# Altium footprint library PCB_Lib_Devzone.PcbLib: 491 footprints (part 16 of 31)
Each footprint in its own frame and in the unit in brackets; x right, y up, seen from the top. Pads: shape width x height; smd on the part's side, far side on the other; paste and mask are expansions set on the pad; w line width, h text height; cw(c..) or ccw(c..) is an arc to the next point about the centre after c.
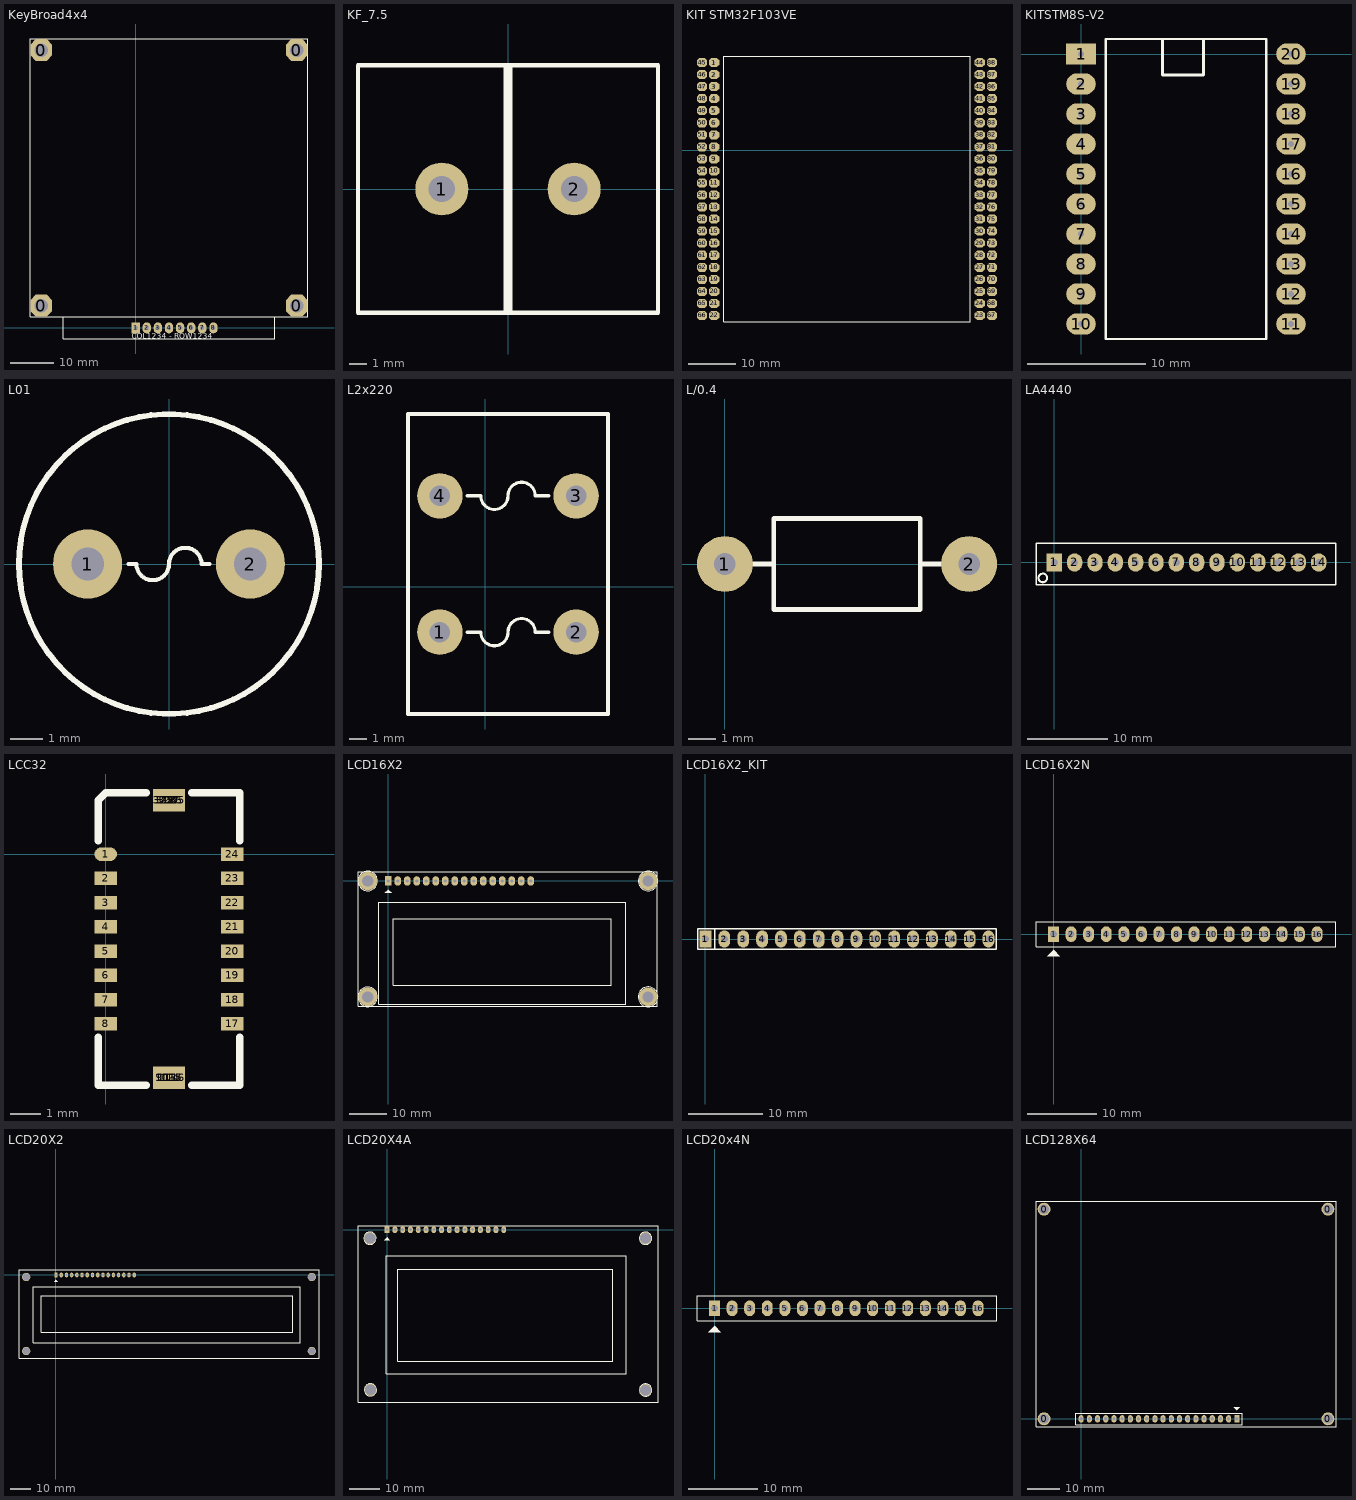
[diagram p15: the footprints below, top view; thin cyan lines are the x and y axes]

## KeyBroad4x4 [mm] "KeyBroad 4x4"
height 5.08
pads (12):
  oct 5x5 hole 3.048: 0(-21.59,5.08) 0(-21.59,63.5) 0(36.83,5.08) 0(36.83,63.5)
  rect 1.905x2.5 hole 1: 1(0,0)
  oval 1.905x2.5 hole 1: 2(2.54,0) 3(5.08,0) 4(7.62,0) 5(10.16,0) 6(12.7,0) 7(15.24,0) 8(17.78,0)
Top Overlay:
  lines w0.203: -16.51,2.54 -16.51,-2.515 -16.535,-2.54 31.75,-2.54 31.75,2.489 ; -24.13,2.54 39.37,2.54 39.37,66.04 -24.13,66.04 -24.13,2.54
  text "COL1234 - ROW1234" at -0.889,-2.464 h1.27

## KF_7.5 [mm]
pads (2):
  round 3 hole 1.5: 1(-3.75,0) 2(3.75,0)
Top Overlay:
  lines w0.254: -8.5,-7 8.5,-7 8.5,7 -8.5,7 -8.5,-7
  lines w0.508: 0,-6.858 0,6.858

## KIT STM32F103VE [mil]
pads (88):
  oct 85x75 hole 23.62: 1(728,728) 2(728,628) 3(728,528) 4(728,428) 5(728,328) 6(728,228) 7(728,128) 8(728,28) 9(728,-72) 10(728,-172) 11(728,-272) 12(728,-372) 13(728,-472) 14(728,-572) 15(728,-672) 16(728,-772) 17(728,-872) 18(728,-972) 19(728,-1072) 20(728,-1172) 21(728,-1272) 22(728,-1372) 23(2932.72,-1372) 24(2932.72,-1272) 25(2932.72,-1172) 26(2932.72,-1072) 27(2932.72,-972) 28(2932.72,-872) 29(2932.72,-772) 30(2932.72,-672) 31(2932.72,-572) 32(2932.72,-472) 33(2932.72,-372) 34(2932.72,-272) 35(2932.72,-172) 36(2932.72,-72) 37(2932.72,28) 38(2932.72,128) 39(2932.72,228) 40(2932.72,328) 41(2932.72,428) 42(2932.72,528) 43(2932.72,628) 44(2932.72,728) 45(628,728) 46(628,628) 47(628,528) 48(628,428) 49(628,328) 50(628,228) 51(628,128) 52(628,28) 53(628,-72) 54(628,-172) 55(628,-272) 56(628,-372) 57(628,-472) 58(628,-572) 59(628,-672) 60(628,-772) 61(628,-872) 62(628,-972) 63(628,-1072) 64(628,-1172) 65(628,-1272) 66(628,-1372) 67(3033.51,-1372) 68(3033.51,-1272) 69(3033.51,-1172) 70(3033.51,-1072) 71(3033.51,-972) 72(3033.51,-872) 73(3033.51,-772) 74(3033.51,-672) 75(3033.51,-572) 76(3033.51,-472) 77(3033.51,-372) 78(3033.51,-272) 79(3033.51,-172) 80(3033.51,-72) 81(3033.51,28) 82(3033.51,128) 83(3033.51,228) 84(3033.51,328) 85(3033.51,428) 86(3033.51,528) 87(3033.51,628) 88(3033.51,728)
Top Overlay:
  lines w7.87: 1805,778 2854.57,778 2854.57,-1422 806.15,-1422 806.15,778 1805.36,778

## KITSTM8S-V2 [mm]
pads (20):
  rect 2.5x1.8 hole 0.5: 1(0,0)
  oval 2.5x1.8 hole 0.5: 2(0,-2.54) 3(0,-5.08) 4(0,-7.62) 5(0,-10.16) 6(0,-12.7) 7(0,-15.24) 8(0,-17.78) 9(0,-20.32) 10(0,-22.86) 11(17.78,-22.86) 12(17.78,-20.32) 13(17.78,-17.78) 14(17.78,-15.24) 15(17.78,-12.7) 16(17.78,-10.16) 17(17.78,-7.62) 18(17.78,-5.08) 19(17.78,-2.54) 20(17.78,0)
Top Overlay:
  lines w0.152: 6.909,1.245 10.363,1.245
  lines w0.2: 8.534,1.27 15.695,1.27 15.695,-24.13 2.085,-24.13 2.085,1.27 8.661,1.27
  lines w0.254: 6.909,1.245 6.909,-1.778 10.363,-1.778 10.363,1.245

## L01 [mil] "Inductor"
pads (2):
  round 85 hole 40: 1(-100,0) 2(100,0)
Top Overlay:
  circle w7: c0,0 r184.39
  lines w5: -50,0 -40,0 ccw(c-20,0) 0,0 cw(c20,0) 40,0 50,0

## L2x220 [mil] "Loc 220"
pads (4):
  round 100 hole 45: 1(-100,-100) 2(200,-100) 3(200,200) 4(-100,200)
Top Overlay:
  lines w7: -10,-100 ccw(c20,-100) 50,-100 cw(c80,-100) 110,-100 ; -10,200 ccw(c20,200) 50,200 cw(c80,200) 110,200
  lines w8: -40,-100 -10,-100 ; -40,200 -10,200 ; 110,-100 140,-100 ; 110,200 140,200 ; -170,-280 270,-280 270,380 -170,380 -170,-280

## L/0.4 [mil] "Inductor , 2 Pin, L 350mil, W 150 mil"
height 150
pads (2):
  round 80 hole 31: 1(0,0) 2(350,0)
Top Overlay:
  lines w7: 70,0 40,0 70,0 ; 70,0 70,65 280,65 280,0 ; 70,0 70,-65 280,-65 280,0 ; 280,0 310,0 280,0

## LA4440 [mil]
pads (14):
  rect 75x90 hole 34: 1(0,0)
  oval 75x90 hole 34: 2(100,0) 3(200,0) 4(300,0) 5(400,0) 6(500,0) 7(600,0) 8(700,0) 9(800,0) 10(900,0) 11(1000,0) 12(1100,0) 13(1200,0) 14(1300,0)
Top Overlay:
  circle w10: c-56.38,-76 r21.38
  lines w7: -90,-110 1385,-110 1385,95 -26,95 -90,95 -90,-110

## LCC32 [mil]
pads (32):
  oval 29.53x17.72 smd: 1(0,0)
  rect 29.53x17.72 smd: 2(0,-31.5) 3(0,-63) 4(0,-94.5) 5(0,-126) 6(0,-157.5) 7(0,-189) 8(0,-220.5) 17(164.5,-220.5) 18(164.5,-189) 19(164.5,-157.5) 20(164.5,-126) 21(164.5,-94.5) 22(164.5,-63) 23(164.5,-31.5) 24(164.5,0)
  rect 17.72x29.53 smd: 9(70,-290.5) 10(73.5,-290.5) 11(77,-290.5) 12(80.5,-290.5) 13(84,-290.5) 14(87.5,-290.5) 15(91,-290.5) 16(94.5,-290.5) 25(94.5,70) 26(91,70) 27(87.5,70) 28(84,70) 29(80.5,70) 30(77,70) 31(73.5,70) 32(70,70)
Top Overlay:
  lines w10: -9.77,-238.22 -9.77,-300.26 52.28,-300.26 ; -9.77,17.72 -9.77,70 0,79.77 52.28,79.77 ; 112.22,-300.26 174.26,-300.26 174.26,-238.22 ; 112.22,79.77 174.26,79.77 174.26,17.72

## LCD16X2 [mil] "LCD dipslay 16x2, 16 pin"
height 400
pads (20):
  rect 70x100 hole 36: 1(0,0)
  oval 70x100 hole 36: 2(100,0) 3(200,0) 4(300,0) 5(400,0) 6(500,0) 7(600,0) 8(700,0) 9(800,0) 10(900,0) 11(1000,0) 12(1100,0) 13(1200,0) 14(1300,0) 15(1400,0) 16(1500,0)
  round 196.85 hole 118.11: "Hole 0"(-216.54,-1220.47) "Hole 0"(-216.54,0) "Hole 0"(2736.22,-1220.47) "Hole 0"(2736.22,0)
Top Overlay:
  circle w7: c-216.54,-1220.47 r102.5
  circle w7: c-216.54,0 r102.47
  circle w7: c2736.22,0 r102.23
  circle w7: c2736.22,-1220.47 r104.23
  region: 0,-90 -35,-125 35,-125
  lines w7: -314.96,-1318.9 2834.65,-1318.9 2834.65,98.43 -314.96,98.43 -314.96,-1318.9 ; -100,-1300 2500,-1300 2500,-225 -100,-225 -100,-1300 ; 50,-1100 50,-400 2350,-400 2350,-1100 50,-1100
3D body "LCD module 16 X 2 backlight.STEP": height 414, standoff -106, extent -314.65,-1360 2854.65,77.01

## LCD16X2_KIT [mil]
pads (16):
  rect 62x90 hole 36: 1(0,0)
  oval 62x90 hole 36: 2(100,0) 3(200,0) 4(300,0) 5(400,0) 6(500,0) 7(600,0) 8(700,0) 9(800,0) 10(900,0) 11(1000,0) 12(1100,0) 13(1200,0) 14(1300,0) 15(1400,0) 16(1500,0)
Top Overlay:
  lines w7: -40,-55 1540,-55 1540,55 -40,55 -40,-55
  lines w7.87: 50,-54 50,54
3D body "LCD module 16 X 2 backlight.STEP": height 854, standoff 334, extent -315,-1366.5 2854.29,70.5
3D body "female_header_a-bl254-eg-g16d.stp": height 334.65, standoff -125.98, extent -51.92,-52.43 1557.92,46
3D body "pin_header_aw140-eg-g16d.stp": height 558.11, standoff 117.17, extent -46,-58 1554,40.36

## LCD16X2N [mil] "LCD dipslay 16x2, 16 pin"
height 400
pads (16):
  rect 62x90 hole 39: 1(0,0)
  oval 62x90 hole 39: 2(100,0) 3(200,0) 4(300,0) 5(400,0) 6(500,0) 7(600,0) 8(700,0) 9(800,0) 10(900,0) 11(1000,0) 12(1100,0) 13(1200,0) 14(1300,0) 15(1400,0) 16(1500,0)
Top Overlay:
  region: 0,-90 -35,-125 35,-125
  lines w7: -100,-71 1608,-71 1608,70 -100,70 -100,-71
3D body "lcd16.STEP": height 764, standoff 244, extent -319.64,-1353.49 2849.65,83.51
3D body "jp16.stp": height 468.11, standoff -20.08, extent -48.03,-48.43 1548.03,50
3D body "socket16.stp": height 276.19, standoff -117.51, extent -50,-44.99 1550,55.01

## LCD20X2 [mil] "LCD dipslay 20x2, 16 pin"
height 400
pads (20):
  rect 62x90 hole 36: 1(0,0)
  oval 62x90 hole 36: 2(100,0) 3(200,0) 4(300,0) 5(400,0) 6(500,0) 7(600,0) 8(700,0) 9(800,0) 10(900,0) 11(1000,0) 12(1100,0) 13(1200,0) 14(1300,0) 15(1400,0) 16(1500,0)
  round 157.48 hole 137.8: "Hole 0"(-570.87,-1456.69) "Hole 0"(-570.87,-39.37) "Hole 0"(4901.57,-1456.69) "Hole 0"(4901.57,-39.37)
Top Overlay:
  region: 0,-90 -35,-125 35,-125
  lines w7: -708.66,-1594.49 5039.37,-1594.49 5039.37,100 -708.66,100 -708.66,-1594.49 ; -436,-1300 4682,-1300 4682,-225 -436,-225 -436,-1300 ; -286,-1100 4532,-1100 4532,-400 -286,-400 -286,-1100
3D body "SW3dPS-Display20x2.STEP": height 198, standoff -180, extent -100,-1437 4470,33

## LCD20X4A [mil] "LCD dipslay 20x4, 16 pin"
height 400
pads (20):
  rect 62x90 hole 39: 1(0,0)
  oval 62x90 hole 39: 2(100,0) 3(200,0) 4(300,0) 5(400,0) 6(500,0) 7(600,0) 8(700,0) 9(800,0) 10(900,0) 11(1000,0) 12(1100,0) 13(1200,0) 14(1300,0) 15(1400,0) 16(1500,0)
  round 157.48 hole 137.8: "Hole 0"(-220,-110) "Hole 0"(-215,-2060) "Hole 0"(3325,-2065) "Hole 0"(3325,-110)
Top Overlay:
  circle w7: c3324.94,-2063 r79.06
  circle w7: c3324.94,-110 r79.06
  circle w7: c-221.06,-110 r79.06
  circle w7: c-215.06,-2061 r79.06
  region: 0,-100 -35,-135 35,-135
  lines w7: -375,-2220 -375,50 3485,50 3485,-2220 -374,-2220 ; -11,-1852 -11,-337 3076,-337 3076,-1852 -11,-1852 ; 139,-1695 139,-512 2905,-512 2905,-1695 139,-1695
3D body "User Library-LCD20_4.STEP": height 417.32, standoff -125.98, extent -392.13,-2264.2 3466.13,98

## LCD20x4N [mil] "LCD dipslay 20x4, 16 pin"
height 400
pads (16):
  rect 62x90 hole 39: 1(0,0)
  oval 62x90 hole 39: 2(100,0) 3(200,0) 4(300,0) 5(400,0) 6(500,0) 7(600,0) 8(700,0) 9(800,0) 10(900,0) 11(1000,0) 12(1100,0) 13(1200,0) 14(1300,0) 15(1400,0) 16(1500,0)
Top Overlay:
  region: 0,-100 -35,-135 35,-135
  lines w7: -100,-71 1608,-71 1608,70 -100,70 -100,-71
3D body "User Library-LCD20_4.STEP": height 417.32, standoff -125.98, extent -392,-2265.2 3466.27,97

## LCD128X64 [mil] "LCD Graphic 128x64, 20 pin"
height 400
pads (24):
  round 157.48 hole 118.11: 0(-452.76,0) 0(-452.76,2559.06) 0(3011.81,0) 0(3011.81,2559.06)
  rect 62x90 hole 39: 1(1900,0)
  oval 62x90 hole 39: 2(1800,0) 3(1700,0) 4(1600,0) 5(1500,0) 6(1400,0) 7(1300,0) 8(1200,0) 9(1100,0) 10(1000,0) 11(900,0) 12(800,0) 13(700,0) 14(600,0) 15(500,0) 16(400,0) 17(300,0) 18(200,0) 19(100,0) 20(0,0)
Top Overlay:
  region: 1900,105 1935,140 1865,140
  lines w7: -65,-70 1965,-70 1965,71 -65,71 -65,-70
  lines w10: -551.18,-98.43 3110.24,-98.43 3110.24,2657.48 -551.18,2657.48 -551.18,-98.43
3D body "User Library-WG12864A.STEP": height 417.32, standoff 0, extent -550.7,-106.95 3110.72,2648.96